# Altium schematic symbol library 常用元件库.SchLib: 1827 symbols (part 9 of 10) (continued)
## TMR (continued)
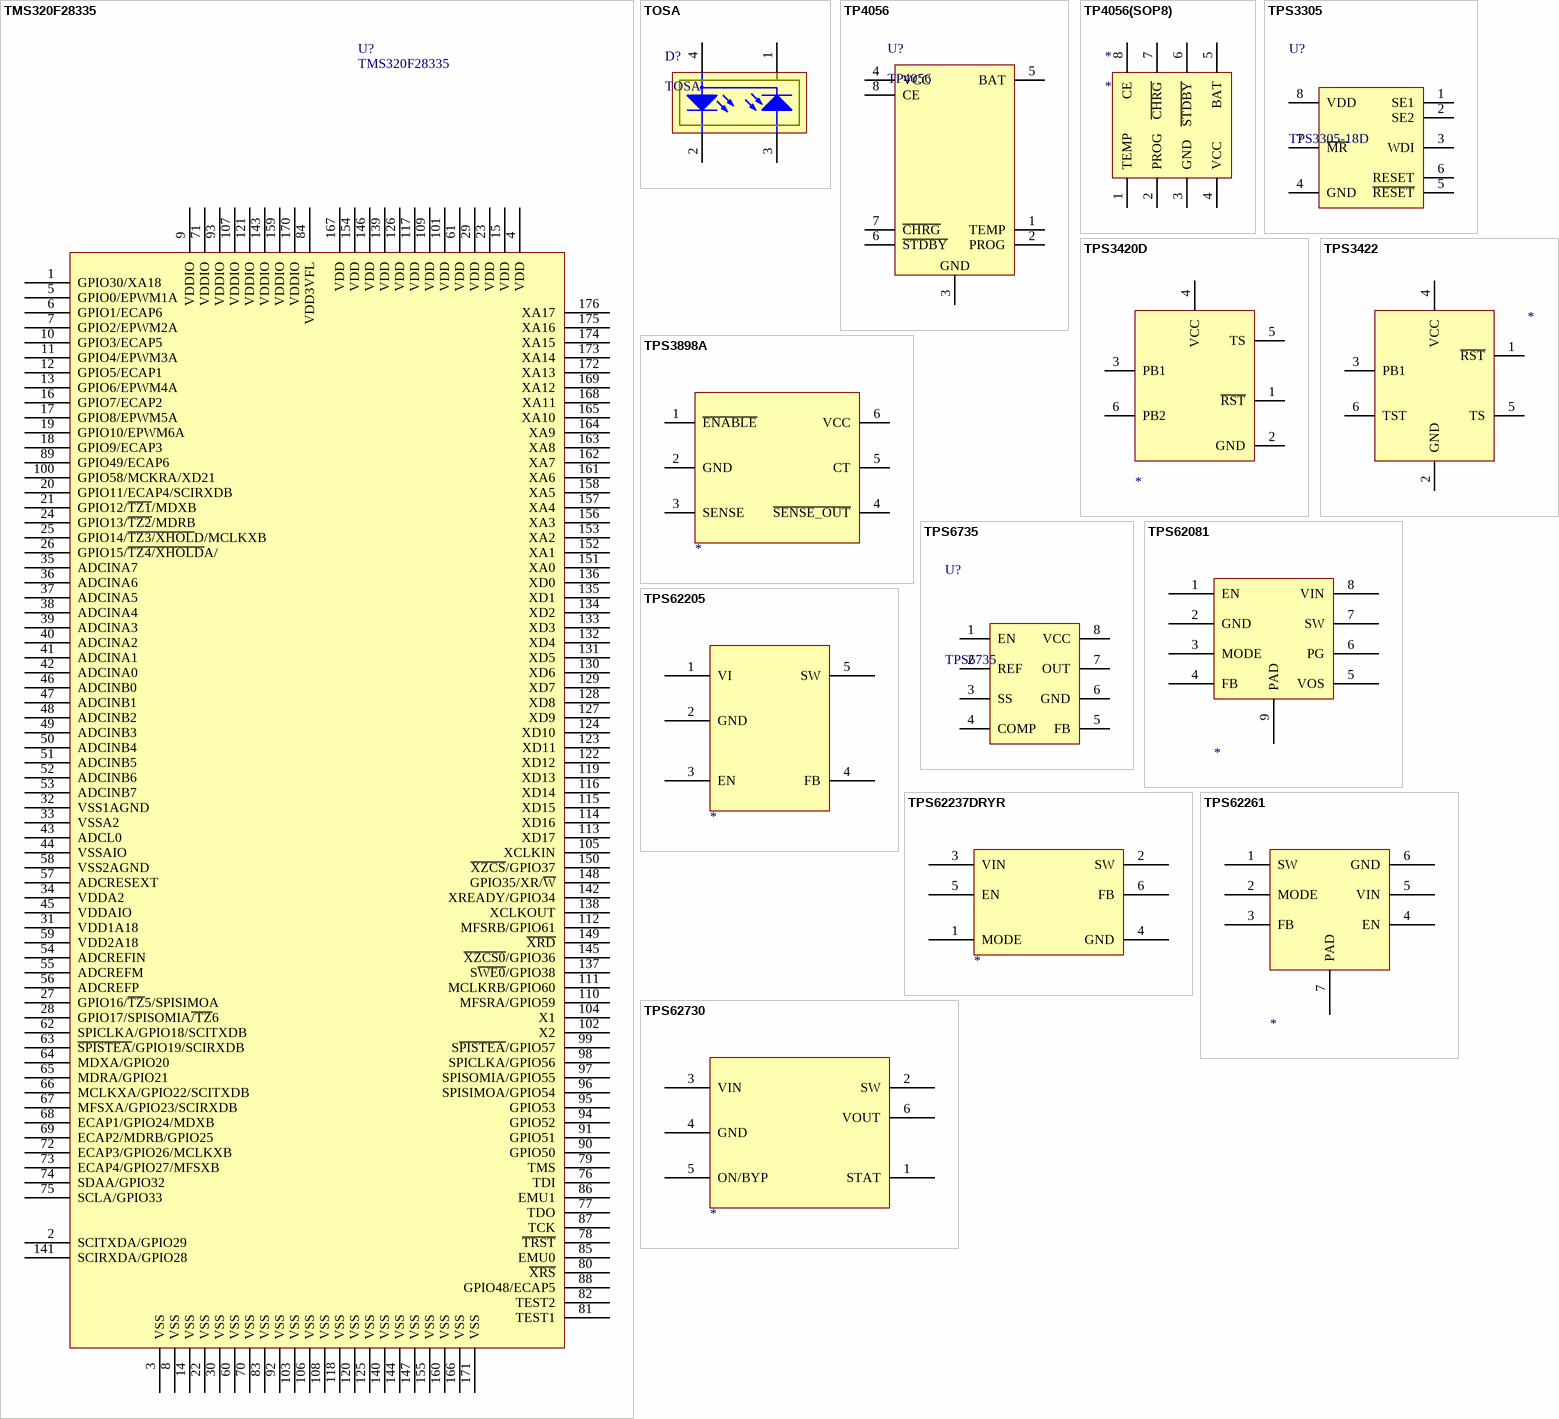
[diagram p72: symbols TMS320F28335 to TPS62730]

## TMS320F28335
designator U?
DSP芯片
footprint LQFP-176_M (Thin QFP, 176-Leads, Body 24x24mm, Pitch 0.5mm, IPC Low Density)
pins: 1 GPIO30/XA18, 2 SCITXDA/GPIO29, 3 VSS, 4 VDD, 5 GPIO0/EPWM1A, 6 GPIO1/ECAP6, 7 GPIO2/EPWM2A, 8 VSS, 9 VDDIO, 10 GPIO3/ECAP5, 11 GPIO4/EPWM3A, 12 GPIO5/ECAP1, 13 GPIO6/EPWM4A, 14 VSS, 15 VDD, 16 GPIO7/ECAP2, 17 GPIO8/EPWM5A, 18 GPIO9/ECAP3, 19 GPIO10/EPWM6A, 20 GPIO11/ECAP4/SCIRXDB, 21 GPIO12/~{TZ1}/MDXB, 22 VSS, 23 VDD, 24 GPIO13/~{TZ2}/MDRB, 25 GPIO14/~{TZ3/XHOL}D/MCLKXB, 26 GPIO15/~{TZ4/XHOLD}A/, 27 GPIO16/~{TZ}5/SPISIMOA, 28 GPIO17/SPISOMIA~{/TZ}6, 29 VDD, 30 VSS, 31 VDD1A18, 32 VSS1AGND, 33 VSSA2, 34 VDDA2, 35 ADCINA7, 36 ADCINA6, 37 ADCINA5, 38 ADCINA4, 39 ADCINA3, 40 ADCINA2, 41 ADCINA1, 42 ADCINA0, 43 ADCL0, 44 VSSAIO, 45 VDDAIO, 46 ADCINB0, 47 ADCINB1, 48 ADCINB2, 49 ADCINB3, 50 ADCINB4, 51 ADCINB5, 52 ADCINB6, 53 ADCINB7, 54 ADCREFIN, 55 ADCREFM, 56 ADCREFP, 57 ADCRESEXT, 58 VSS2AGND, 59 VDD2A18, 60 VSS, 61 VDD, 62 SPICLKA/GPIO18/SCITXDB, 63 ~{SPISTEA}/GPIO19/SCIRXDB, 64 MDXA/GPIO20, 65 MDRA/GPIO21, 66 MCLKXA/GPIO22/SCITXDB, 67 MFSXA/GPIO23/SCIRXDB, 68 ECAP1/GPIO24/MDXB, 69 ECAP2/MDRB/GPIO25, 70 VSS, 71 VDDIO, 72 ECAP3/GPIO26/MCLKXB, 73 ECAP4/GPIO27/MFSXB, 74 SDAA/GPIO32, 75 SCLA/GPIO33, 76 TDI, 77 TDO, 78 ~{TRST}, 79 TMS, 80 ~{XRS}, 81 TEST1, 82 TEST2, 83 VSS, 84 VDD3VFL, 85 EMU0, 86 EMU1, 87 TCK, 88 GPIO48/ECAP5, 89 GPIO49/ECAP6, 90 GPIO50, 91 GPIO51, 92 VSS, 93 VDDIO, 94 GPIO52, 95 GPIO53, 96 SPISIMOA/GPIO54, 97 SPISOMIA/GPIO55, 98 SPICLKA/GPIO56, 99 S~{PISTEA}/GPIO57, 100 GPIO58/MCKRA/XD21, 101 VDD, 102 X2, 103 VSS, 104 X1, 105 XCLKIN, 106 VSS, 107 VDDIO, 108 VSS, 109 VDD, 110 MFSRA/GPIO59, 111 MCLKRB/GPIO60, 112 MFSRB/GPIO61, 113 XD17, 114 XD16, 115 XD15, 116 XD14, 117 VDD, 118 VSS, 119 XD13, 120 VSS, 121 VDDIO, 122 XD12, 123 XD11, 124 XD10, 125 VSS, 126 VDD, 127 XD9, 128 XD8, 129 XD7, 130 XD6, 131 XD5, 132 XD4, 133 XD3, 134 XD2, 135 XD1, 136 XD0, 137 S~{WE0}/GPIO38, 138 XCLKOUT, 139 VDD, 140 VSS, 141 SCIRXDA/GPIO28, 142 XREADY/GPIO34, 143 VDDIO, 144 VSS, 145 ~{XZCS0}/GPIO36, 146 VDD, 147 VSS, 148 GPIO35/XR/~{W}, 149 ~{XRD}, 150 ~{XZCS}/GPIO37, 151 XA0, 152 XA1, 153 XA2, 154 VDD, 155 VSS, 156 XA3, 157 XA4, 158 XA5, 159 VDDIO, 160 VSS, 161 XA6, 162 XA7, 163 XA8, 164 XA9, 165 XA10, 166 VSS, 167 VDD, 168 XA11, 169 XA12, 170 VDDIO, 171 VSS, 172 XA13, 173 XA14, 174 XA15, 175 XA16, 176 XA17

## TOSA
designator D?
激光器
footprint LD-4P
pins: 1 GND, 2 LD-, 3 PD, 4 PW

## TP4056
designator U?
锂电池充电管理
footprint NSO8_TP4056 (SOIC-max660)
pins: 1 TEMP, 2 PROG, 3 GND, 4 VCC, 5 BAT, 6 ~{STDBY}, 7 ~{CHRG}, 8 CE

## TP4056(SOP8)
designator *
footprint NSO8_TP4056 (SOIC-max660)
pins: 1 TEMP, 2 PROG, 3 GND, 4 VCC, 5 BAT, 6 ~{STDBY}, 7 ~{CHRG}, 8 CE

## TPS3305
designator U?, comment TPS3305-18D
DSP电源管理
footprint TSSOP-8
pins: 1 SE1, 2 SE2, 3 WDI, 4 GND, 5 ~{RESET}, 6 RESET, 7 ~{MR}, 8 VDD

## TPS3420D
designator ?
pins: 1 ~{RST}, 2 GND, 3 PB1, 4 VCC, 5 TS, 6 PB2

## TPS3422
designator ?
pins: 1 ~{RST}, 2 GND, 3 PB1, 4 VCC, 5 TS, 6 TST

## TPS3898A
designator ?
pins: 1 ~{ENABLE}, 2 GND, 3 SENSE, 4 ~{SENSE_OUT}, 5 CT, 6 VCC

## TPS6735
designator U?
负电压芯片
footprint NSO8_N (SOIC-max660)
pins: 1 EN, 2 REF, 3 SS, 4 COMP, 5 FB, 6 GND, 7 OUT, 8 VCC

## TPS62081
designator ?
pins: 1 EN, 2 GND, 3 MODE, 4 FB, 5 VOS, 6 PG, 7 SW, 8 VIN, 9 PAD

## TPS62205
designator ?
pins: 1 VI, 2 GND, 3 EN, 4 FB, 5 SW

## TPS62237DRYR
designator ?
pins: 1 MODE, 2 SW, 3 VIN, 4 GND, 5 EN, 6 FB

## TPS62261
designator ?
pins: 1 SW, 2 MODE, 3 FB, 4 EN, 5 VIN, 6 GND, 7 PAD

## TPS62730
designator ?
pins: 1 STAT, 2 SW, 3 VIN, 4 GND, 5 ON/BYP, 6 VOUT

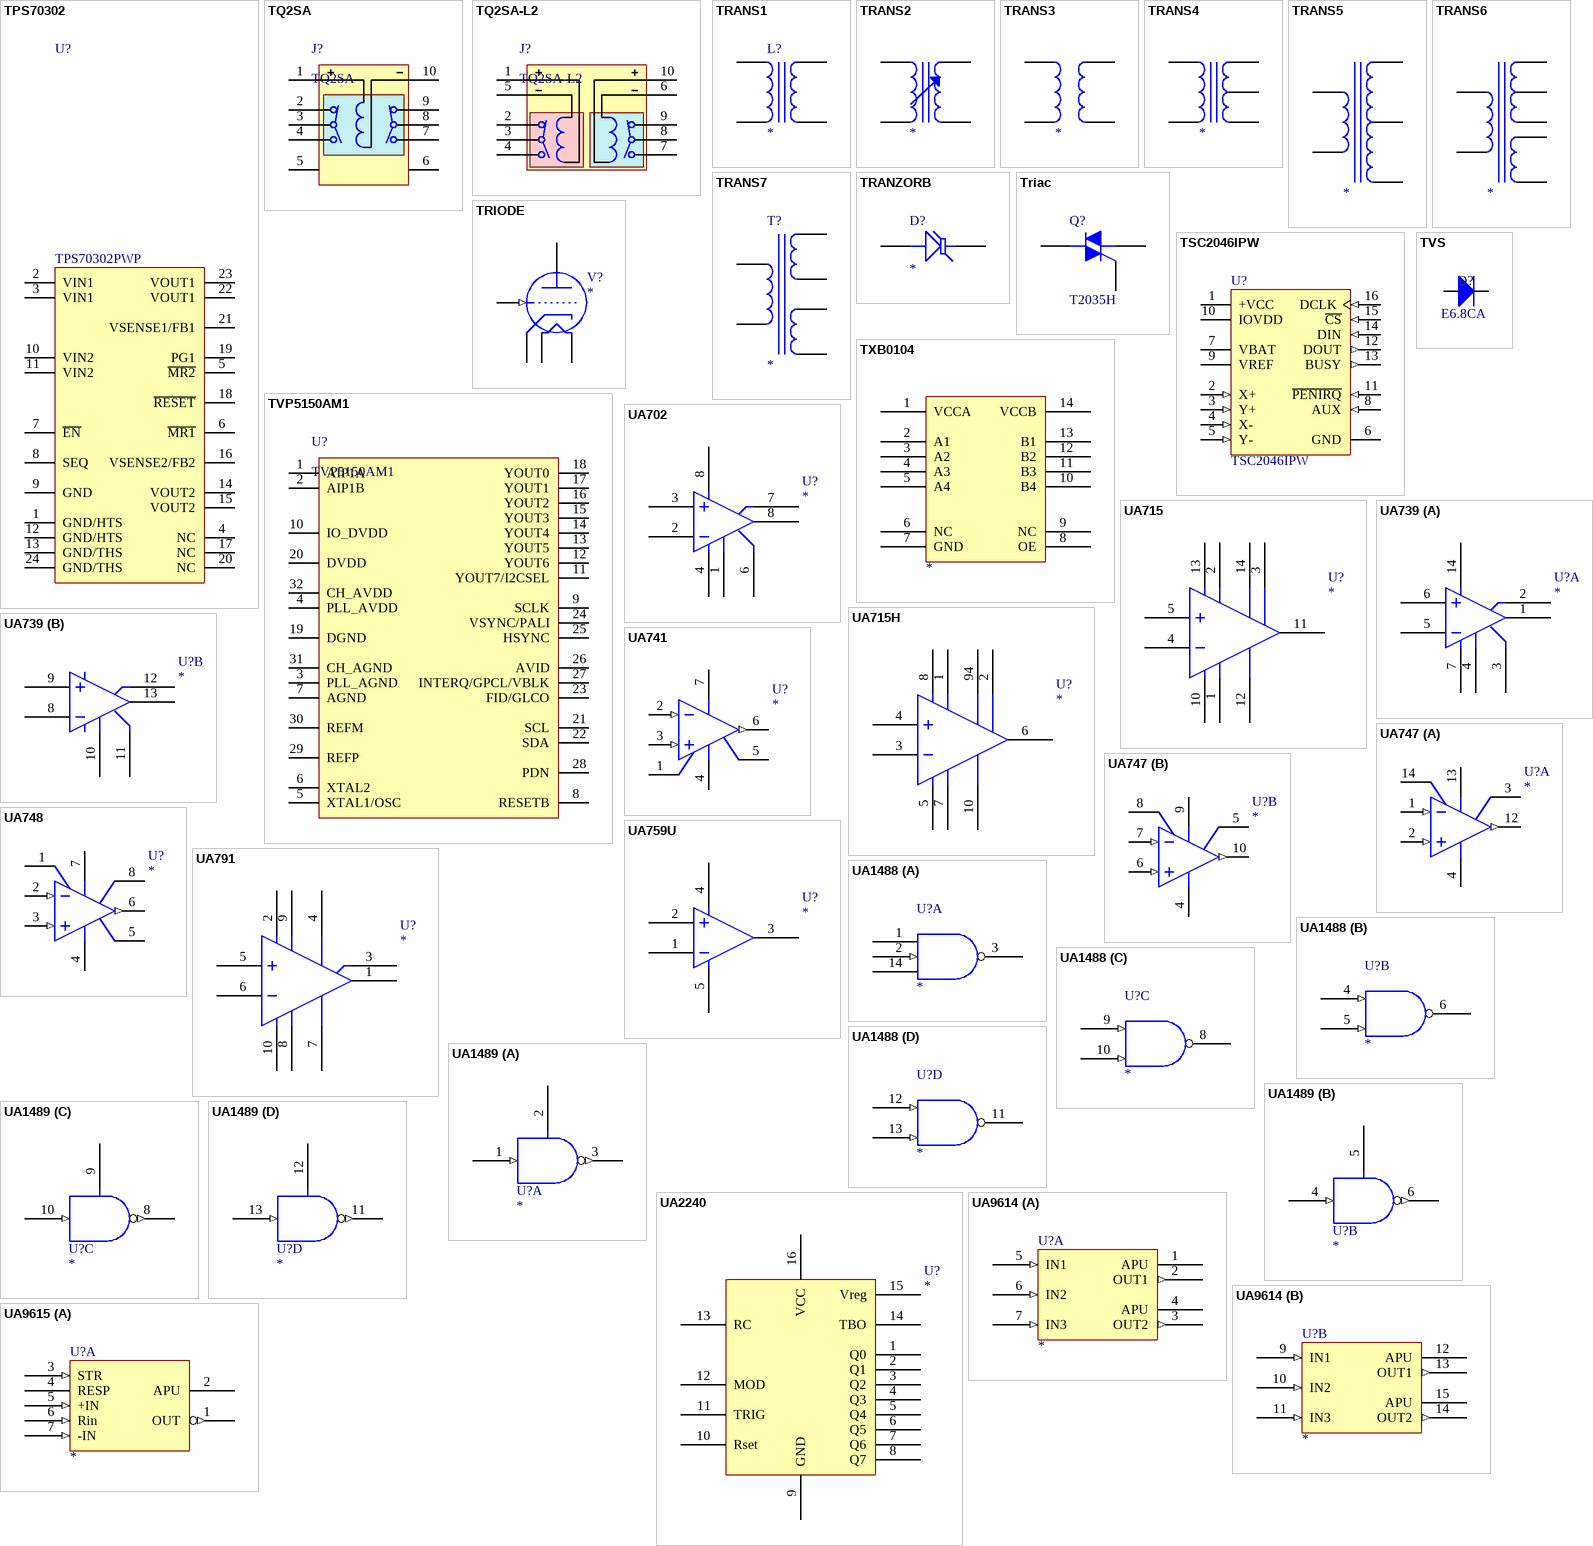
[diagram p73: symbols TPS70302 to UA9615]

## TPS70302
designator U?, comment TPS70302PWP
DSP电源芯片
footprint TSSOP24P (Shrink Small Outline; 24 Leads; Body Width 4.4 mm; Pitch 0.65 mm)
pins: 1 GND/HTS, 2 VIN1, 3 VIN1, 4 NC, 5 ~{MR2}, 6 ~{MR1}, 7 ~{EN}, 8 SEQ, 9 GND, 10 VIN2, 11 VIN2, 12 GND/HTS, 13 GND/THS, 14 VOUT2, 15 VOUT2, 16 VSENSE2/FB2, 17 NC, 18 ~{RESET}, 19 PG1, 20 NC, 21 VSENSE1/FB1, 22 VOUT1, 23 VOUT1, 24 GND/THS

## TQ2SA
designator J?
单通道继电器
footprint SOP254P1150X560-10N (双继电器10PIN)
pins: 1, 2, 3, 4, 5, 6, 7, 8, 9, 10

## TQ2SA-L2
designator J?
双通道双稳态继电器
footprint SOP254P1150X560-10N (双继电器10PIN)
pins: 1, 2, 3, 4, 5, 6, 7, 8, 9, 10

## TRANS1
designator L?
footprint L6-18
pins: 1, 2, 3, 4

## TRANS2
designator ?
pins: 1, 2, 3, 4

## TRANS3
designator ?
pins: 1, 2, 3, 4

## TRANS4
designator ?
pins: 1, 2, 3, 4, 5

## TRANS5
designator ?
pins: 1, 2, 3, 4, 5

## TRANS6
designator ?
pins: 1, 1, 2, 3, 4, 5, 7

## TRANS7
designator T?
pins: 1, 2, 3, 4, 5, 6

## TRANZORB
designator D?
pins: 1 A, 2 K

## Triac
designator Q?, comment T2035H
Silicon Bidirectional Triode Thyristor; Note: Pin 2 is electrically connected to Pin 4 (TAB); Published: 29-Sep-2000; LatestRevisionDate: 17-Jul-2002; LatestRevisionNote: Re-released for DXP Platform.; DatasheetVersion: 1999; PackageReference: 369-03; Publisher: Altium Limited; PackageDescription: TO, Thru-Hole, Vertical, Heatsink Mounted; 3 In-Line Leads; Pitch 2.28 mm; ComponentLink1Description: Manufacturer Link; ComponentLink1URL: http://www.motorola.com/
footprint BTA20-600B
pins: 1 M1, 2 M2, 3 G

## TRIODE
designator V?
Thyratron
pins: 1 GRID (in), 2 PLATE, 3 CATHODE, 4 FILAMENT1, 5 FILAMENT2

## TSC2046IPW
designator U?
触摸驱动芯片; Published: 6-Oct-2005; DatasheetVersion: Jan-2005; PackageVersion: Feb-1999; PackageReference: PW016; Publisher: Altium Limited; PackageDescription: Shrink Small Outline; 16 Leads; Body Width 4.4 mm; Pitch 0.65 mm; ComponentLink1Description: Manufacturer Link; ComponentLink1URL: http://focus.ti.com/docs/prod/folders/print/tsc2046.html; ComponentLink2Description: Datasheet; ComponentLink2URL: http://focus.ti.com/lit/ds/symlink/tcs2046.pdf
footprint PW016 (Shrink Small Outline; 16 Leads; Body Width 4.4 mm; Pitch 0.65 mm)
pins: 1 +VCC (power), 2 X+ (in), 3 Y+ (in), 4 X- (in), 5 Y- (in), 6 GND (power), 7 VBAT (power), 8 AUX (in), 9 VREF (power), 10 IOVDD (power), 11 ~{PENIRQ} (in), 12 DOUT (out), 13 BUSY (out), 14 DIN (in), 15 ~{CS} (in), 16 DCLK (in)

## TVP5150AM1
designator U?
视频解码芯片
footprint TQFP-32
pins: 1 AIP1A, 2 AIP1B, 3 PLL_AGND, 4 PLL_AVDD, 5 XTAL1/OSC, 6 XTAL2, 7 AGND, 8 RESETB, 9 SCLK, 10 IO_DVDD, 11 YOUT7/I2CSEL, 12 YOUT6, 13 YOUT5, 14 YOUT4, 15 YOUT3, 16 YOUT2, 17 YOUT1, 18 YOUT0, 19 DGND, 20 DVDD, 21 SCL, 22 SDA, 23 FID/GLCO, 24 VSYNC/PALI, 25 HSYNC, 26 AVID, 27 INTERQ/GPCL/VBLK, 28 PDN, 29 REFP, 30 REFM, 31 CH_AGND, 32 CH_AVDD

## TVS
designator D?  Type: E6.8CA  (hidden comment: TVS)
TVS保护; Published: 8-Jun-2000; LatestRevisionDate: 17-Jul-2002; LatestRevisionNote: Re-released for DXP Platform.; PackageDocument: Sep-1996; PackageReference: SMC; Publisher: Altium Limited; Code_JEDEC: DO-214-AB
footprint DIODE-AXL (直插二极管)
footprint DIODE-1206 (玻璃封装二极管)
footprint DIODE-SMA (贴片二极管)
footprint DIODE-SMB (DO-214-AA/SMB; 2 C-Bend Leads; Body 5.3 x 3.6 mm, inc. leads (LxW))
pins: 1 A, 2 K

## TXB0104
designator ?
pins: 1 VCCA, 2 A1, 3 A2, 4 A3, 5 A4, 6 NC, 7 GND, 8 OE, 9 NC, 10 B4, 11 B3, 12 B2, 13 B1, 14 VCCB

## UA702
designator U?
footprint DIP-8
pins: 1, 2, 3, 4, 6, 7, 8, 8

## UA715
designator U?
footprint DIP-14
pins: 1, 2, 3, 4, 5, 10, 11, 12, 13, 14

## UA715H
designator U?
footprint METAL10
pins: 1, 2, 3, 4, 5, 6, 7, 8, 10, 94

## UA739
designator U?
footprint DIP-14
part A pins: 1, 2, 3, 4, 5, 6, 7, 14
part B pins: 8, 9, 10, 11, 12, 13

## UA741
designator U?
General-Purpose Operational Amplifier
footprint DIP-8
simulation model UA741 (SUBCKT)
pins: 1 OFFSET NULL 1, 2 -IN (in), 3 +IN (in), 4 V- (power), 5 OFFSET NULL 2, 6 OUT (out), 7 V+ (power)

## UA747
designator U?
Dual General-Purpose Operational Amplifiers
footprint DIP-14
simulation model UA747 (SUBCKT)
part A pins: 1 IN1- (in), 2 IN1+ (in), 3 O.S. 1N2, 4 VCC- (power), 12 OUT (out), 13 VCC+ (power), 14 O.S. 1N1
part B pins: 4 VCC- (power), 5 O.S. 2N2, 6 IN2+ (in), 7 IN2- (in), 8 O.S. 2N1, 9 VCC+ (power), 10 OUT (out)

## UA748
designator U?
General-Purpose Operational Amplifiers
footprint DIP-8
simulation model UA748 (SUBCKT)
pins: 1 N1/COMP, 2 IN- (in), 3 IN+ (in), 4 VCC- (power), 5 N2, 6 OUT (out), 7 VCC+ (power), 8 COMP

## UA759U
designator U?
footprint MOLDED4
pins: 1, 2, 3, 4, 5

## UA791
designator U?
footprint METAL10
pins: 1, 2, 3, 4, 5, 6, 7, 8, 9, 10

## UA1488
designator U?
footprint DIP-14
part A pins: 1 -V (power), 2 (in), 3 (oc), 7 GND (power) hidden to GND, 14 +V (power)
part B pins: 4 (in), 5 (in), 6 (oc), 7 GND (power) hidden to GND
part C pins: 7 GND (power) hidden to GND, 8 (oc), 9 (in), 10 (in)
part D pins: 7 GND (power) hidden to GND, 11 (oc), 12 (in), 13 (in)

## UA1489
designator U?
footprint DIP-14
part A pins: 1 (in), 2, 3 (out), 7 GND (power) hidden to GND, 14 VCC (power) hidden to VCC
part B pins: 4 (in), 5, 6 (out), 7 GND (power) hidden to GND, 14 VCC (power) hidden to VCC
part C pins: 7 GND (power) hidden to GND, 8 (out), 9, 10 (in), 14 VCC (power) hidden to VCC
part D pins: 7 GND (power) hidden to GND, 11 (out), 12, 13 (in), 14 VCC (power) hidden to VCC

## UA2240
designator U?
footprint DIP-16
pins: 1 Q0, 2 Q1, 3 Q2, 4 Q3, 5 Q4, 6 Q5, 7 Q6, 8 Q7, 9 GND, 10 Rset, 11 TRIG, 12 MOD, 13 RC, 14 TBO, 15 Vreg, 16 VCC

## UA9614
designator U?
footprint DIP-16
part A pins: 1 APU, 2 OUT1 (out), 3 OUT2 (out), 4 APU, 5 IN1 (in), 6 IN2 (in), 7 IN3 (in), 8 GND (power) hidden to GND, 16 VCC (power) hidden to VCC
part B pins: 8 GND (power) hidden to GND, 9 IN1 (in), 10 IN2 (in), 11 IN3 (in), 12 APU, 13 OUT1 (out), 14 OUT2 (out), 15 APU, 16 VCC (power) hidden to VCC

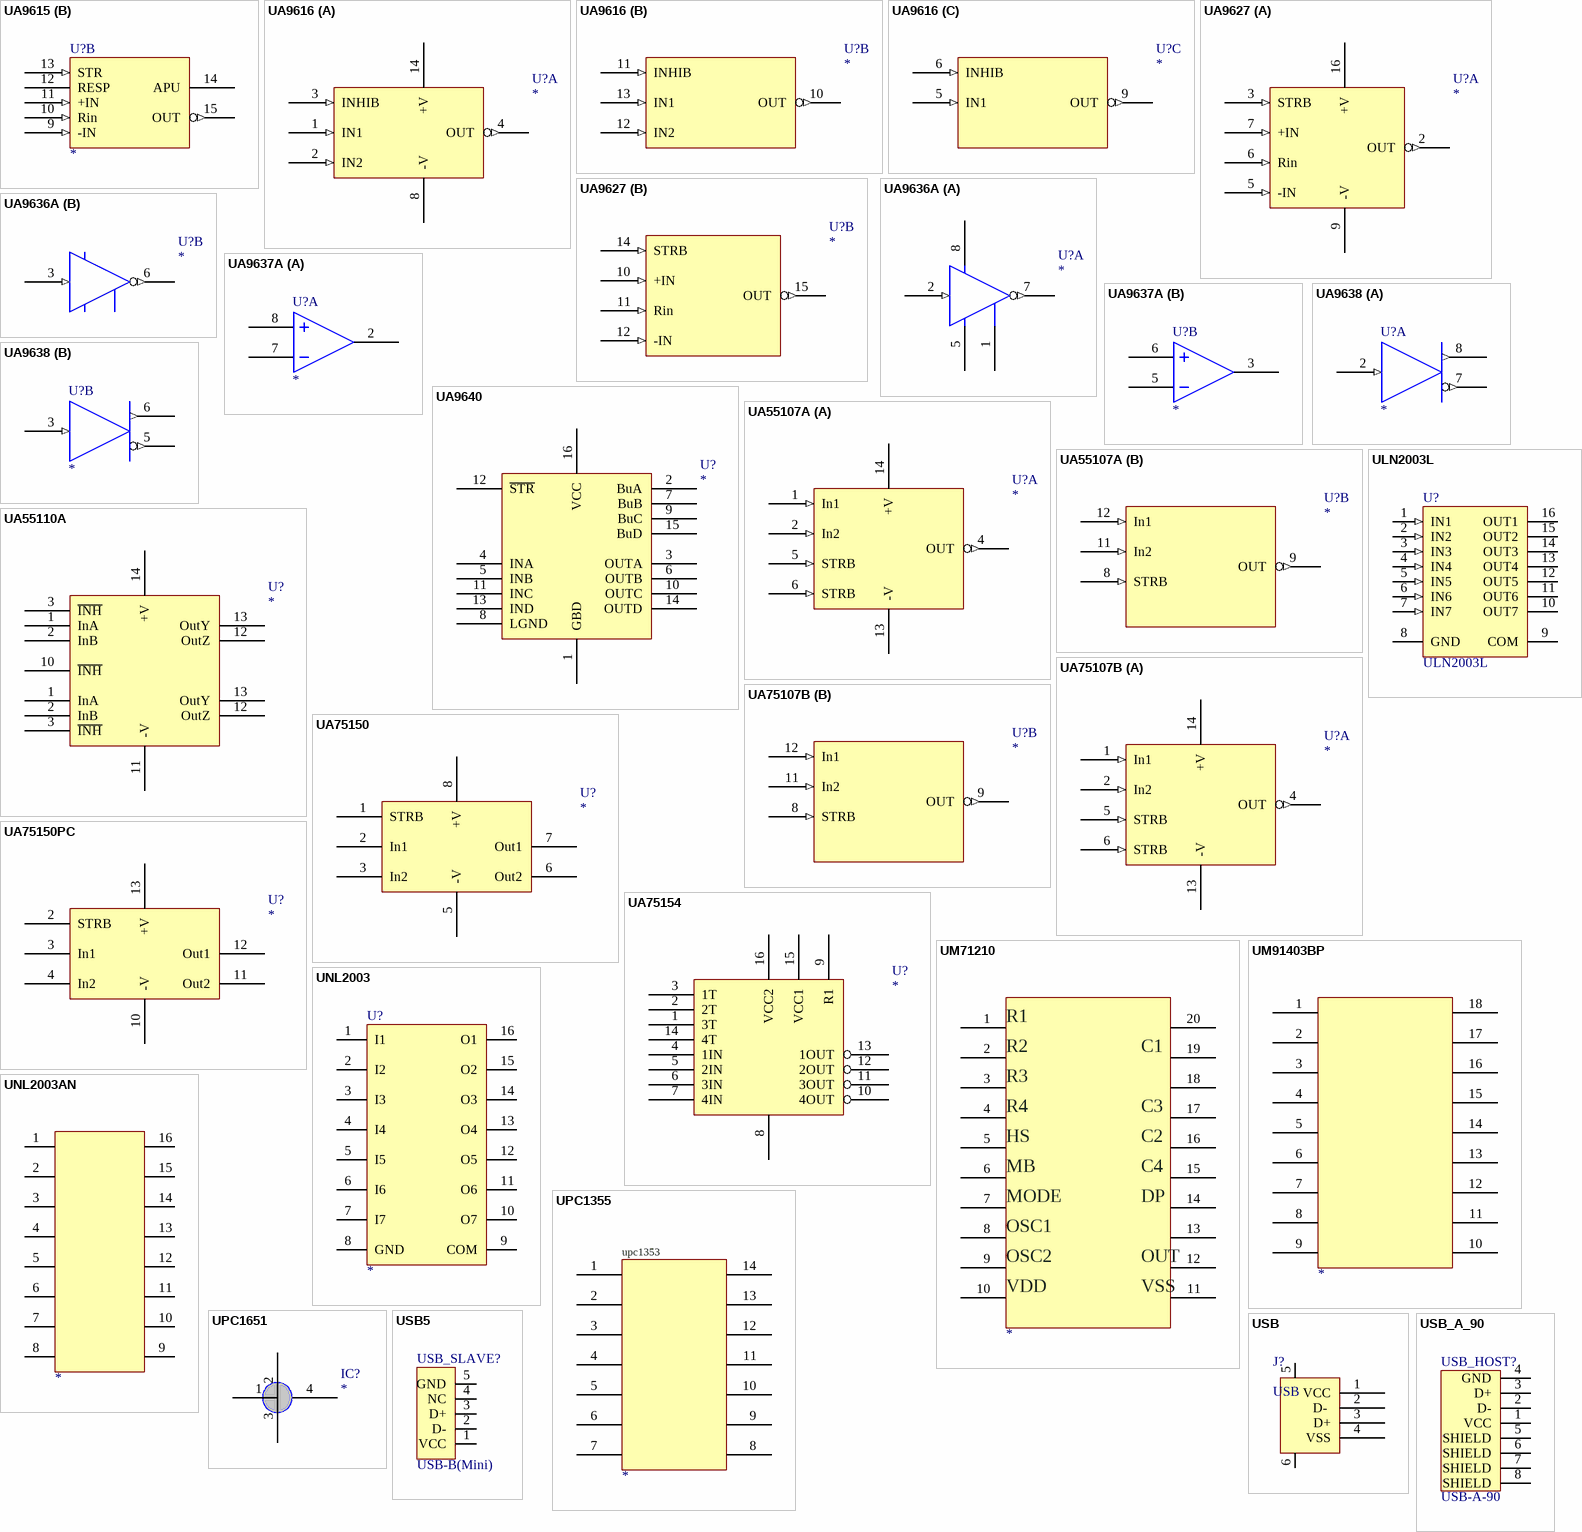
[diagram p74: symbols UA9615 to USB_A_90]

## UA9615
designator U?
footprint DIP-16
part A pins: 1 OUT (out), 2 APU, 3 STR (in), 4 RESP, 5 +IN (in), 6 Rin (in), 7 -IN (in), 8 GND (power) hidden to GND, 16 VCC (power) hidden to VCC
part B pins: 8 GND (power) hidden to GND, 9 -IN (in), 10 Rin (in), 11 +IN (in), 12 RESP, 13 STR (in), 14 APU, 15 OUT (out), 16 VCC (power) hidden to VCC

## UA9616
designator U?
footprint DIP-14
part A pins: 1 IN1 (in), 2 IN2 (in), 3 INHIB (in), 4 OUT (out), 7 GND (power) hidden to GND, 8 -V, 14 +V
part B pins: 7 GND (power) hidden to GND, 10 OUT (out), 11 INHIB (in), 12 IN2 (in), 13 IN1 (in)
part C pins: 5 IN1 (in), 6 INHIB (in), 7 GND (power) hidden to GND, 9 OUT (out)

## UA9627
designator U?
footprint DIP-16
part A pins: 2 OUT (out), 3 STRB (in), 5 -IN (in), 6 Rin (in), 7 +IN (in), 8 GND (power) hidden to GND, 9 -V, 16 +V
part B pins: 8 GND (power) hidden to GND, 10 +IN (in), 11 Rin (in), 12 -IN (in), 14 STRB (in), 15 OUT (out)

## UA9636A
designator U?
footprint DIP-8
part A pins: 1, 2 (in), 4 GND (power) hidden to GND, 5, 7 (out), 8
part B pins: 3 (in), 4 GND (power) hidden to GND, 6 (out)

## UA9637A
designator U?
footprint DIP-8
part A pins: 1 VCC (power) hidden to VCC, 2, 4 GND (power) hidden to GND, 7, 8
part B pins: 1 VCC (power) hidden to VCC, 3, 4 GND (power) hidden to GND, 5, 6

## UA9638
designator U?
footprint DIP-8
part A pins: 1 VCC (power) hidden to VCC, 2 (in), 4 GND (power) hidden to GND, 7 (out), 8 (out)
part B pins: 1 VCC (power) hidden to VCC, 3 (in), 4 GND (power) hidden to GND, 5 (out), 6 (out)

## UA9640
designator U?
footprint DIP-16
pins: 1 GBD, 2 BuA, 3 OUTA, 4 INA, 5 INB, 6 OUTB, 7 BuB, 8 LGND, 9 BuC, 10 OUTC, 11 INC, 12 ~{STR}, 13 IND, 14 OUTD, 15 BuD, 16 VCC

## UA55107A
designator U?
footprint DIP-14
part A pins: 1 In1 (in), 2 In2 (in), 4 OUT (out), 5 STRB (in), 6 STRB (in), 7 GND (power) hidden to GND, 13 -V, 14 +V
part B pins: 7 GND (power) hidden to GND, 8 STRB (in), 9 OUT (out), 11 In2 (in), 12 In1 (in)

## UA55110A
designator U?
footprint DIP-14
pins: 1 InA, 1 InA, 2 InB, 2 InB, 3 ~{INH}, 3 ~{INH}, 7 GND (power) hidden to GND, 10 ~{INH}, 11 -V, 12 OutZ, 12 OutZ, 13 OutY, 13 OutY, 14 +V

## UA75107B
designator U?
footprint DIP-14
part A pins: 1 In1 (in), 2 In2 (in), 4 OUT (out), 5 STRB (in), 6 STRB (in), 7 GND (power) hidden to GND, 13 -V, 14 +V
part B pins: 7 GND (power) hidden to GND, 8 STRB (in), 9 OUT (out), 11 In2 (in), 12 In1 (in)

## UA75150
designator U?
footprint DIP-8
pins: 1 STRB, 2 In1, 3 In2, 4 GND (power) hidden to GND, 5 -V, 6 Out2, 7 Out1, 8 +V

## UA75150PC
designator U?
footprint DIP-14
pins: 2 STRB, 3 In1, 4 In2, 5 GND (power) hidden to GND, 10 -V, 11 Out2, 12 Out1, 13 +V

## UA75154
designator U?
footprint DIP-16
pins: 1 3T, 2 2T, 3 1T, 4 1IN, 5 2IN, 6 3IN, 7 4IN, 8, 9 R1, 10 4OUT, 11 3OUT, 12 2OUT, 13 1OUT, 14 4T, 15 VCC1, 16 VCC2

## ULN2003L
designator U?
驱动芯片; Published: 13-Oct-2000; LatestRevisionDate: 13-Apr-2006; LatestRevisionNote: IPC-7351 Footprint Added.; DatasheetVersion: 1998; PackageReference: L16; Publisher: Altium Limited; PackageDescription: 16-Pin Small Outline Integrated Circuit 1.27 mm Pitch; Code_JEDEC: MS-012-AC; Code_IPC: SOIC127P600-16; ComponentLink1Description: Manufacturer Link; ComponentLink1URL: http://www.allegromicro.com/
footprint NSO16_M (SOIC, 16-Leads, Body 9.9x3.9mm, Pitch 1.27mm, IPC Low Density)
pins: 1 IN1 (in), 2 IN2 (in), 3 IN3 (in), 4 IN4 (in), 5 IN5 (in), 6 IN6 (in), 7 IN7 (in), 8 GND (power), 9 COM, 10 OUT7 (oc), 11 OUT6 (oc), 12 OUT5 (oc), 13 OUT4 (oc), 14 OUT3 (oc), 15 OUT2 (oc), 16 OUT1 (oc)

## UM71210
designator ?
pins: 1, 2, 3, 4, 5, 6, 7, 8, 9, 10, 11, 12, 13, 14, 15, 16, 17, 18, 19, 20
text: R1; R2; C1; R3; R4; C3; HS; C2; MB; C4; MODE; DP; OSC1; OSC2; OUT; VDD; VSS

## UM91403BP
designator ?
footprint DIP-18
pins: 1, 2, 3, 4, 5, 6, 7, 8, 9, 10, 11, 12, 13, 14, 15, 16, 17, 18

## UNL2003
designator U?
footprint DIP-16
pins: 1 I1, 2 I2, 3 I3, 4 I4, 5 I5, 6 I6, 7 I7, 8 GND, 9 COM, 10 O7, 11 O6, 12 O5, 13 O4, 14 O3, 15 O2, 16 O1

## UNL2003AN
designator ?
pins: 1, 2, 3, 4, 5, 6, 7, 8, 9, 10, 11, 12, 13, 14, 15, 16

## UPC1355
designator ?
footprint DIP-14
pins: 1, 2, 3, 4, 5, 6, 7, 8, 9, 10, 11, 12, 13, 14
text: upc1353

## UPC1651
designator IC?
footprint IC1
pins: 1, 2, 3, 4

## USB
designator J?
USB接口
footprint USB_B1 (USB方?)
footprint USB_A1
footprint USB_C1 (侧卧USB)
pins: 1 VCC, 2 D- , 3 D+, 4 VSS, 5, 6

## USB5
designator USB_SLAVE?, comment USB-B(Mini)
footprint USB/SM0.8-6H5
pins: 1 VCC, 2 D-, 3 D+, 4 NC, 5 GND

## USB_A_90
designator USB_HOST?, comment USB-A-90
footprint USB-A-90
pins: 1 VCC, 2 D-, 3 D+, 4 GND, 5 SHIELD, 6 SHIELD, 7 SHIELD, 8 SHIELD

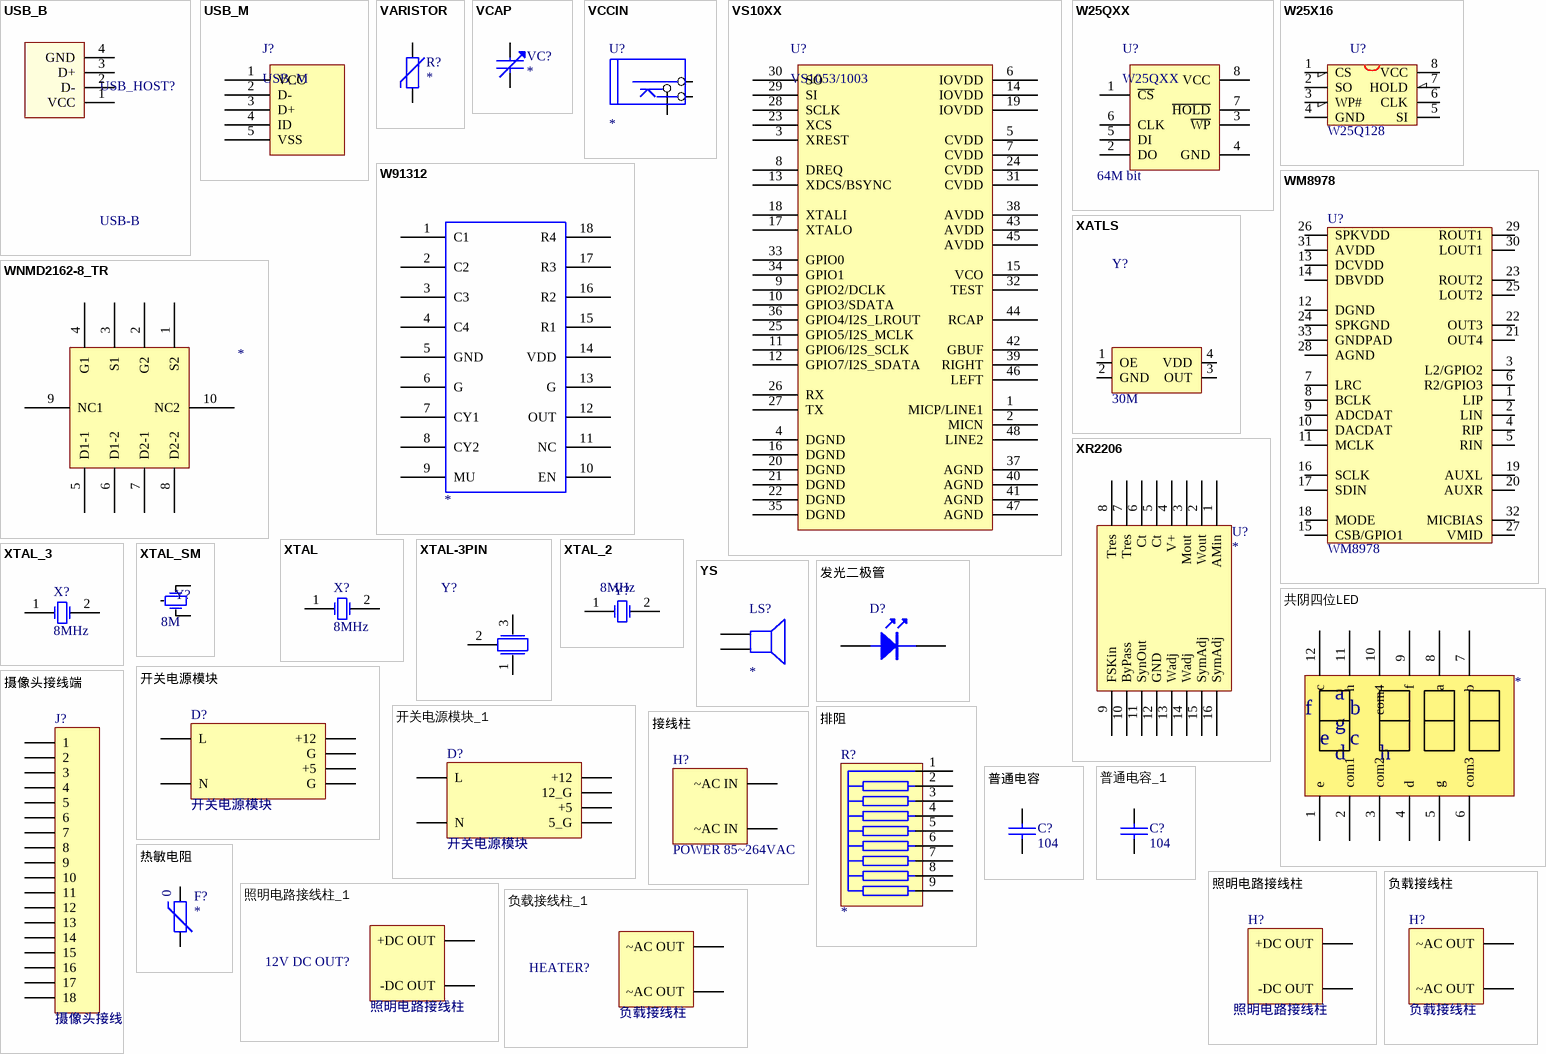
[diagram p75: symbols USB_B to 负载接线柱_1]

## USB_B
designator USB_HOST?, comment USB-B
footprint USB-A-01
pins: 1 VCC, 2 D-, 3 D+, 4 GND

## USB_M
designator J?
MicroUSB接口
footprint USB_MICRO (USB方孔)
pins: 1 VCC, 2 D- , 3 D+, 4 ID, 5 VSS

## VARISTOR
designator R?
footprint AXIAL0.4
pins: 1, 2

## VCAP
designator VC?
footprint VBC
pins: 1, 2

## VCCIN
designator U?
footprint VCCIN
pins: 1, 2, 3

## VS10XX
designator U?, comment VS1053/1003
音频解码芯片
footprint LQFP-48_M (Thin QFP, 48-Leads, Body 7x7mm, Pitch 0.5mm, IPC Low Density)
pins: 1 MICP/LINE1, 2 MICN, 3 XREST, 4 DGND, 5 CVDD, 6 IOVDD, 7 CVDD, 8 DREQ, 9 GPIO2/DCLK, 10 GPIO3/SDATA, 11 GPIO6/I2S_SCLK, 12 GPIO7/I2S_SDATA, 13 XDCS/BSYNC, 14 IOVDD, 15 VCO, 16 DGND, 17 XTALO, 18 XTALI, 19 IOVDD, 20 DGND, 21 DGND, 22 DGND, 23 XCS, 24 CVDD, 25 GPIO5/I2S_MCLK, 26 RX, 27 TX, 28 SCLK, 29 SI, 30 SO, 31 CVDD, 32 TEST, 33 GPIO0, 34 GPIO1, 35 DGND, 36 GPIO4/I2S_LROUT, 37 AGND, 38 AVDD, 39 RIGHT, 40 AGND, 41 AGND, 42 GBUF, 43 AVDD, 44 RCAP, 45 AVDD, 46 LEFT, 47 AGND, 48 LINE2

## W25QXX
designator U?  Memory: 64M bit
SPI FLASH
footprint SOIC8_W (SPI_FLASH)
pins: 1 ~{CS}, 2 DO, 3 ~{WP}, 4 GND, 5 DI, 6 CLK, 7 ~{HOLD}, 8 VCC

## W25X16
designator U?, comment W25Q128
W25X16;SST25VF016;MX25L1605
footprint SOIC-8 (SOIC)
pins: 1 CS, 2 SO, 3 WP#, 4 GND, 5 SI, 6 CLK, 7 HOLD, 8 VCC

## W91312
designator ?
pins: 1 C1, 2 C2, 3 C3, 4 C4, 5 GND, 6 G, 7 CY1, 8 CY2, 9 MU, 10 EN, 11 NC, 12 OUT, 13 G, 14 VDD, 15 R1, 16 R2, 17 R3, 18 R4

## WM8978
designator U?
24bit ADC&DAC
footprint qfn32 (QFN, 32-Leads, Body 5.0x5.0mm (max), Pitch 0.50mm, IPC Medium Density)
pins: 1 LIP, 2 LIN, 3 L2/GPIO2, 4 RIP, 5 RIN, 6 R2/GPIO3, 7 LRC, 8 BCLK, 9 ADCDAT, 10 DACDAT, 11 MCLK, 12 DGND, 13 DCVDD, 14 DBVDD, 15 CSB/GPIO1, 16 SCLK, 17 SDIN, 18 MODE, 19 AUXL, 20 AUXR, 21 OUT4, 22 OUT3, 23 ROUT2, 24 SPKGND, 25 LOUT2, 26 SPKVDD, 27 VMID, 28 AGND, 29 ROUT1, 30 LOUT1, 31 AVDD, 32 MICBIAS, 33 GNDPAD

## WNMD2162-8_TR
designator ?
pins: 1 S2, 2 G2, 3 S1, 4 G1, 5 D1-1, 6 D1-2, 7 D2-1, 8 D2-2, 9 NC1, 10 NC2

## XATLS
designator Y?  value 30M  (hidden comment: XATLS)
贴片有源晶振
footprint X-CPX75
pins: 1 OE, 2 GND, 3 OUT, 4 VDD

## XR2206
designator U?
footprint DIP-16
pins: 1 AMin, 2 Wout, 3 Mout, 4 V+, 5 Ct, 6 Ct, 7 Tres, 8 Tres, 9 FSKin, 10 ByPass, 11 SynOut, 12 GND, 13 Wadj, 14 Wadj, 15 SymAdj, 16 SymAdj